# Altium schematic symbol library IC_ADI.SCHLIB: 3169 symbols (part 25 of 181)
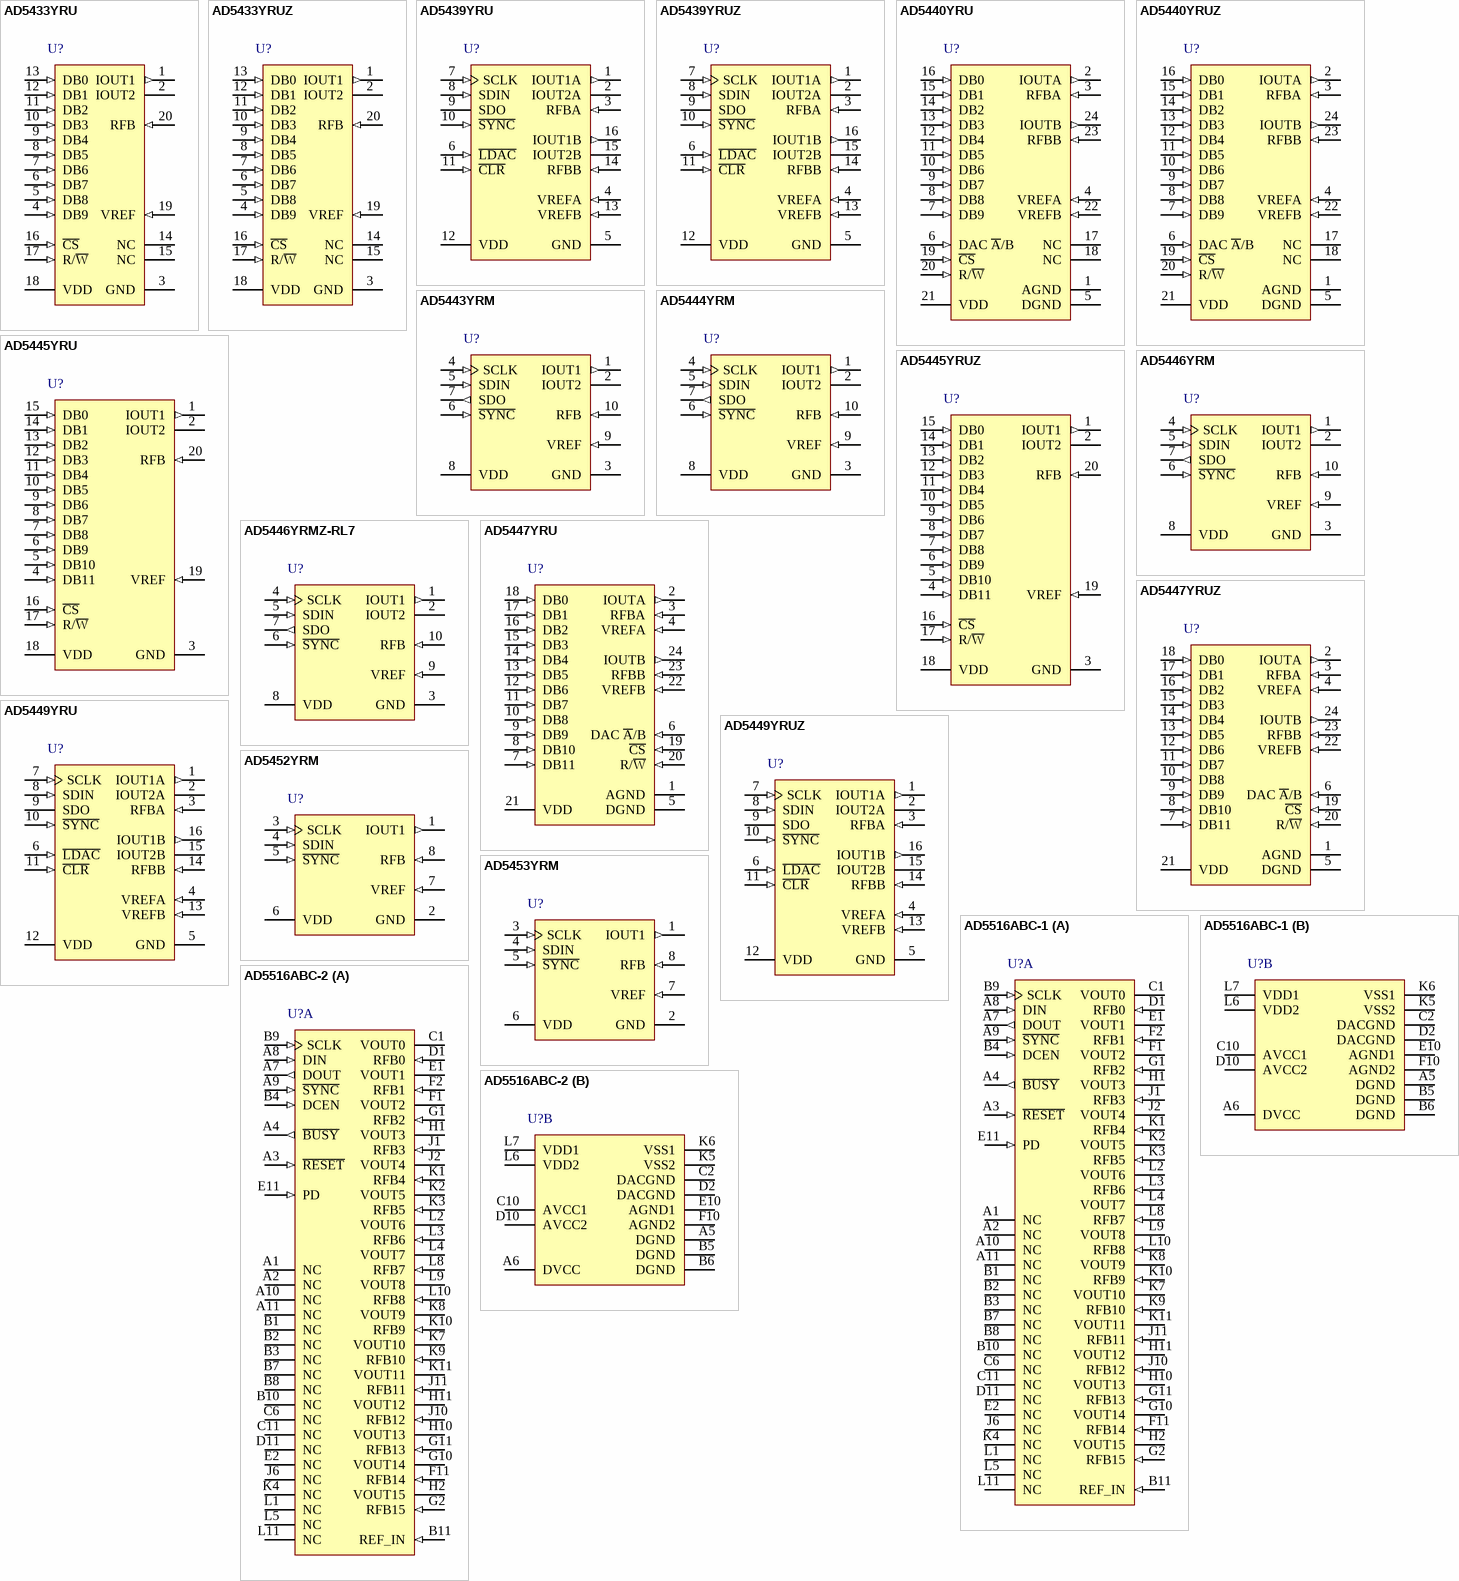
[diagram p215: symbols AD5433YRU to AD5516ABC-2]

## AD5516ABC-1
designator U?
16 Channel 14-Bit Digital-to-Analog Converter, -40 to +85 degC, BC-74, Tray; Generic Part Number: AD5516; PartNumber: AD5516ABC-1; # DAC Outputs: 16; Max V+: 13.2V; Op Pwr Diss: 243mW; Resolution (Bits): 14; Settling Time: 32祍; Single Supply: No; DatasheetVersion: Rev.B; PackageVersion: 061306-A; PackageReference: BC-74; PackageDescription: 74-Ball Chip Scale Package Ball Grid Array [CSP_BGA]; Supplier Part Number 1: AD5516ABC-1-ND; Supplier Part Number 2: 97C8341; Supplier Part Number 3: 584-AD5516ABC-1; Packing: Tray; RoHS: N; Mounting Technology: Surface Mount; Code_JEDEC: MO-192-ABD-1; ComponentLink1Description: Manufacturer URL; ComponentLink2Description: Datasheet; ComponentLink3Description: Package Specification; ComponentLink4Description: Product URL
footprint BGA74_1.0(12X12) (Footprint not found)
part A pins: A1 NC "Not Internally Connected", A2 NC "Not Internally Connected", A3 ~{RESET} (in) "Active Low Control Input. This resets all DAC registers to power-on value.", A4 ~{BUSY} (out) "Active Low Output. This signal tells the user that the analog calibration loop is active. It goes low during conversion.The duration of the pulse on B\U\S\Y\ determines the maximum DAC update rate, fUPDATE. Further writes to (See Datasheet)", A7 DOUT (out) "Serial Data Output. DOUT can be used for daisy-chaining a number of devices together or for reading back the data in the shift register for diagnostic purposes. Data is clocked out on DOUT on the rising edge of SCLK and is (See Datasheet)", A8 DIN (in) "Serial Data Input. Data must be valid on the falling edge of SCLK.", A9 ~{SYNC} (in) "Active Low Input. This is the frame synchronization signal for the serial interface. While S\Y\N\C\ is low, data is transferred in on the falling edge of SCLK.", A10 NC "Not Internally Connected", A11 NC "Not Internally Connected", B1 NC "Not Internally Connected", B2 NC "Not Internally Connected", B3 NC "Not Internally Connected", B4 DCEN (in) "Active High Control Input. This pin is tied high to enable Daisy-Chain Mode.", B7 NC "Not Internally Connected", B8 NC "Not Internally Connected", B9 SCLK (in) "Serial Clock Input. Data is clocked into the shift register on the falling edge of SCLK. This operates at clock speeds up to 20 MHz.", B10 NC "Not Internally Connected", B11 REF_IN (in) "Reference Input Voltage for All 16 DACs. The recommended value of REF_IN is 3 V.", C1 VOUT0 (hiz) "Analog Output Voltages from the 16 DAC Channels", C6 NC "Not Internally Connected", C11 NC "Not Internally Connected", D1 RFB0 (in) "Feedback Resistors. For nominal output voltage range, connect each RFB to its corresponding VOUT. Access to the feedback resistors enables the user to increase the DAC current drive or generate programmable current sources. (See Datasheet)", D11 NC "Not Internally Connected", E1 VOUT1 (hiz) "Analog Output Voltages from the 16 DAC Channels", E2 NC "Not Internally Connected", E11 PD (in) "Active High Control Input. All DACs go into power-down mode when this pin is high. The DAC outputs go into a high impedance state.", F1 VOUT2 (hiz) "Analog Output Voltages from the 16 DAC Channels", F2 RFB1 (in) "Feedback Resistors. For nominal output voltage range, connect each RFB to its corresponding VOUT. Access to the feedback resistors enables the user to increase the DAC current drive or generate programmable current sources. (See Datasheet)", F11 RFB14 (in) "Feedback Resistors. For nominal output voltage range, connect each RFB to its corresponding VOUT. Access to the feedback resistors enables the user to increase the DAC current drive or generate programmable current sources. (See Datasheet)", G1 RFB2 (in) "Feedback Resistors. For nominal output voltage range, connect each RFB to its corresponding VOUT. Access to the feedback resistors enables the user to increase the DAC current drive or generate programmable current sources. (See Datasheet)", G2 RFB15 (in) "Feedback Resistors. For nominal output voltage range, connect each RFB to its corresponding VOUT. Access to the feedback resistors enables the user to increase the DAC current drive or generate programmable current sources. (See Datasheet)", G10 VOUT14 (hiz) "Analog Output Voltages from the 16 DAC Channels", G11 RFB13 (in) "Feedback Resistors. For nominal output voltage range, connect each RFB to its corresponding VOUT. Access to the feedback resistors enables the user to increase the DAC current drive or generate programmable current sources. (See Datasheet)", H1 VOUT3 (hiz) "Analog Output Voltages from the 16 DAC Channels", H2 VOUT15 (hiz) "Analog Output Voltages from the 16 DAC Channels", H10 VOUT13 (hiz) "Analog Output Voltages from the 16 DAC Channels", H11 VOUT12 (hiz) "Analog Output Voltages from the 16 DAC Channels", J1 RFB3 (in) "Feedback Resistors. For nominal output voltage range, connect each RFB to its corresponding VOUT. Access to the feedback resistors enables the user to increase the DAC current drive or generate programmable current sources. (See Datasheet)", J2 VOUT4 (hiz) "Analog Output Voltages from the 16 DAC Channels", J6 NC "Not Internally Connected", J10 RFB12 (in) "Feedback Resistors. For nominal output voltage range, connect each RFB to its corresponding VOUT. Access to the feedback resistors enables the user to increase the DAC current drive or generate programmable current sources. (See Datasheet)", J11 RFB11 (in) "Feedback Resistors. For nominal output voltage range, connect each RFB to its corresponding VOUT. Access to the feedback resistors enables the user to increase the DAC current drive or generate programmable current sources. (See Datasheet)", K1 RFB4 (in) "Feedback Resistors. For nominal output voltage range, connect each RFB to its corresponding VOUT. Access to the feedback resistors enables the user to increase the DAC current drive or generate programmable current sources. (See Datasheet)", K2 VOUT5 (hiz) "Analog Output Voltages from the 16 DAC Channels", K3 RFB5 (in) "Feedback Resistors. For nominal output voltage range, connect each RFB to its corresponding VOUT. Access to the feedback resistors enables the user to increase the DAC current drive or generate programmable current sources. (See Datasheet)", K4 NC "Not Internally Connected", K7 VOUT10 (hiz) "Analog Output Voltages from the 16 DAC Channels", K8 VOUT9 (hiz) "Analog Output Voltages from the 16 DAC Channels", K9 RFB10 (in) "Feedback Resistors. For nominal output voltage range, connect each RFB to its corresponding VOUT. Access to the feedback resistors enables the user to increase the DAC current drive or generate programmable current sources. (See Datasheet)", K10 RFB9 (in) "Feedback Resistors. For nominal output voltage range, connect each RFB to its corresponding VOUT. Access to the feedback resistors enables the user to increase the DAC current drive or generate programmable current sources. (See Datasheet)", K11 VOUT11 (hiz) "Analog Output Voltages from the 16 DAC Channels", L1 NC "Not Internally Connected", L2 VOUT6 (hiz) "Analog Output Voltages from the 16 DAC Channels", L3 RFB6 (in) "Feedback Resistors. For nominal output voltage range, connect each RFB to its corresponding VOUT. Access to the feedback resistors enables the user to increase the DAC current drive or generate programmable current sources. (See Datasheet)", L4 VOUT7 (hiz) "Analog Output Voltages from the 16 DAC Channels", L5 NC "Not Internally Connected", L8 RFB7 (in) "Feedback Resistors. For nominal output voltage range, connect each RFB to its corresponding VOUT. Access to the feedback resistors enables the user to increase the DAC current drive or generate programmable current sources. (See Datasheet)", L9 VOUT8 (hiz) "Analog Output Voltages from the 16 DAC Channels", L10 RFB8 (in) "Feedback Resistors. For nominal output voltage range, connect each RFB to its corresponding VOUT. Access to the feedback resistors enables the user to increase the DAC current drive or generate programmable current sources. (See Datasheet)", L11 NC "Not Internally Connected"
part B pins: A5 DGND (power) "Digital GND Pins", A6 DVCC (power) "Digital Supply Pin. Voltage range from 2.7 V to 5.25 V.", B5 DGND (power) "Digital GND Pins", B6 DGND (power) "Digital GND Pins", C2 DACGND (power) "Reference GND Supply for All 16 DACs", C10 AVCC1 (power) "Analog Supply Pins. Voltage range from 4.75 V to 5.25 V.", D2 DACGND (power) "Reference GND Supply for All 16 DACs", D10 AVCC2 (power) "Analog Supply Pins. Voltage range from 4.75 V to 5.25 V.", E10 AGND1 (power) "Analog GND Pins", F10 AGND2 (power) "Analog GND Pins", K5 VSS2 (power) "VSS Supply Pins. Voltage range from -4.75 V to -15.75 V.", K6 VSS1 (power) "VSS Supply Pins. Voltage range from -4.75 V to -15.75 V.", L6 VDD2 (power) "VDD Supply Pins. Voltage range from 4.75 V to 15.75 V.", L7 VDD1 (power) "VDD Supply Pins. Voltage range from 4.75 V to 15.75 V."

## AD5516ABC-2
designator U?
16 Channel 14-Bit Digital-to-Analog Converter, -40 to +85 degC, BC-74, Tray; Generic Part Number: AD5516; PartNumber: AD5516ABC-2; # DAC Outputs: 16; Max V+: 13.2V; Op Pwr Diss: 243mW; Resolution (Bits): 14; Settling Time: 32祍; Single Supply: No; DatasheetVersion: Rev.B; PackageVersion: 061306-A; PackageReference: BC-74; PackageDescription: 74-Ball Chip Scale Package Ball Grid Array [CSP_BGA]; Supplier Part Number 1: AD5516ABC-2-ND; Supplier Part Number 2: 584-AD5516ABC-2; Packing: Tray; RoHS: N; Mounting Technology: Surface Mount; Code_JEDEC: MO-192-ABD-1; ComponentLink1Description: Manufacturer URL; ComponentLink2Description: Datasheet; ComponentLink3Description: Package Specification; ComponentLink4Description: Product URL
footprint BGA74_1.0(12X12) (Footprint not found)
part A pins: A1 NC "Not Internally Connected", A2 NC "Not Internally Connected", A3 ~{RESET} (in) "Active Low Control Input. This resets all DAC registers to power-on value.", A4 ~{BUSY} (out) "Active Low Output. This signal tells the user that the analog calibration loop is active. It goes low during conversion.The duration of the pulse on B\U\S\Y\ determines the maximum DAC update rate, fUPDATE. Further writes to (See Datasheet)", A7 DOUT (out) "Serial Data Output. DOUT can be used for daisy-chaining a number of devices together or for reading back the data in the shift register for diagnostic purposes. Data is clocked out on DOUT on the rising edge of SCLK and is (See Datasheet)", A8 DIN (in) "Serial Data Input. Data must be valid on the falling edge of SCLK.", A9 ~{SYNC} (in) "Active Low Input. This is the frame synchronization signal for the serial interface. While S\Y\N\C\ is low, data is transferred in on the falling edge of SCLK.", A10 NC "Not Internally Connected", A11 NC "Not Internally Connected", B1 NC "Not Internally Connected", B2 NC "Not Internally Connected", B3 NC "Not Internally Connected", B4 DCEN (in) "Active High Control Input. This pin is tied high to enable Daisy-Chain Mode.", B7 NC "Not Internally Connected", B8 NC "Not Internally Connected", B9 SCLK (in) "Serial Clock Input. Data is clocked into the shift register on the falling edge of SCLK. This operates at clock speeds up to 20 MHz.", B10 NC "Not Internally Connected", B11 REF_IN (in) "Reference Input Voltage for All 16 DACs. The recommended value of REF_IN is 3 V.", C1 VOUT0 (hiz) "Analog Output Voltages from the 16 DAC Channels", C6 NC "Not Internally Connected", C11 NC "Not Internally Connected", D1 RFB0 (in) "Feedback Resistors. For nominal output voltage range, connect each RFB to its corresponding VOUT. Access to the feedback resistors enables the user to increase the DAC current drive or generate programmable current sources. (See Datasheet)", D11 NC "Not Internally Connected", E1 VOUT1 (hiz) "Analog Output Voltages from the 16 DAC Channels", E2 NC "Not Internally Connected", E11 PD (in) "Active High Control Input. All DACs go into power-down mode when this pin is high. The DAC outputs go into a high impedance state.", F1 VOUT2 (hiz) "Analog Output Voltages from the 16 DAC Channels", F2 RFB1 (in) "Feedback Resistors. For nominal output voltage range, connect each RFB to its corresponding VOUT. Access to the feedback resistors enables the user to increase the DAC current drive or generate programmable current sources. (See Datasheet)", F11 RFB14 (in) "Feedback Resistors. For nominal output voltage range, connect each RFB to its corresponding VOUT. Access to the feedback resistors enables the user to increase the DAC current drive or generate programmable current sources. (See Datasheet)", G1 RFB2 (in) "Feedback Resistors. For nominal output voltage range, connect each RFB to its corresponding VOUT. Access to the feedback resistors enables the user to increase the DAC current drive or generate programmable current sources. (See Datasheet)", G2 RFB15 (in) "Feedback Resistors. For nominal output voltage range, connect each RFB to its corresponding VOUT. Access to the feedback resistors enables the user to increase the DAC current drive or generate programmable current sources. (See Datasheet)", G10 VOUT14 (hiz) "Analog Output Voltages from the 16 DAC Channels", G11 RFB13 (in) "Feedback Resistors. For nominal output voltage range, connect each RFB to its corresponding VOUT. Access to the feedback resistors enables the user to increase the DAC current drive or generate programmable current sources. (See Datasheet)", H1 VOUT3 (hiz) "Analog Output Voltages from the 16 DAC Channels", H2 VOUT15 (hiz) "Analog Output Voltages from the 16 DAC Channels", H10 VOUT13 (hiz) "Analog Output Voltages from the 16 DAC Channels", H11 VOUT12 (hiz) "Analog Output Voltages from the 16 DAC Channels", J1 RFB3 (in) "Feedback Resistors. For nominal output voltage range, connect each RFB to its corresponding VOUT. Access to the feedback resistors enables the user to increase the DAC current drive or generate programmable current sources. (See Datasheet)", J2 VOUT4 (hiz) "Analog Output Voltages from the 16 DAC Channels", J6 NC "Not Internally Connected", J10 RFB12 (in) "Feedback Resistors. For nominal output voltage range, connect each RFB to its corresponding VOUT. Access to the feedback resistors enables the user to increase the DAC current drive or generate programmable current sources. (See Datasheet)", J11 RFB11 (in) "Feedback Resistors. For nominal output voltage range, connect each RFB to its corresponding VOUT. Access to the feedback resistors enables the user to increase the DAC current drive or generate programmable current sources. (See Datasheet)", K1 RFB4 (in) "Feedback Resistors. For nominal output voltage range, connect each RFB to its corresponding VOUT. Access to the feedback resistors enables the user to increase the DAC current drive or generate programmable current sources. (See Datasheet)", K2 VOUT5 (hiz) "Analog Output Voltages from the 16 DAC Channels", K3 RFB5 (in) "Feedback Resistors. For nominal output voltage range, connect each RFB to its corresponding VOUT. Access to the feedback resistors enables the user to increase the DAC current drive or generate programmable current sources. (See Datasheet)", K4 NC "Not Internally Connected", K7 VOUT10 (hiz) "Analog Output Voltages from the 16 DAC Channels", K8 VOUT9 (hiz) "Analog Output Voltages from the 16 DAC Channels", K9 RFB10 (in) "Feedback Resistors. For nominal output voltage range, connect each RFB to its corresponding VOUT. Access to the feedback resistors enables the user to increase the DAC current drive or generate programmable current sources. (See Datasheet)", K10 RFB9 (in) "Feedback Resistors. For nominal output voltage range, connect each RFB to its corresponding VOUT. Access to the feedback resistors enables the user to increase the DAC current drive or generate programmable current sources. (See Datasheet)", K11 VOUT11 (hiz) "Analog Output Voltages from the 16 DAC Channels", L1 NC "Not Internally Connected", L2 VOUT6 (hiz) "Analog Output Voltages from the 16 DAC Channels", L3 RFB6 (in) "Feedback Resistors. For nominal output voltage range, connect each RFB to its corresponding VOUT. Access to the feedback resistors enables the user to increase the DAC current drive or generate programmable current sources. (See Datasheet)", L4 VOUT7 (hiz) "Analog Output Voltages from the 16 DAC Channels", L5 NC "Not Internally Connected", L8 RFB7 (in) "Feedback Resistors. For nominal output voltage range, connect each RFB to its corresponding VOUT. Access to the feedback resistors enables the user to increase the DAC current drive or generate programmable current sources. (See Datasheet)", L9 VOUT8 (hiz) "Analog Output Voltages from the 16 DAC Channels", L10 RFB8 (in) "Feedback Resistors. For nominal output voltage range, connect each RFB to its corresponding VOUT. Access to the feedback resistors enables the user to increase the DAC current drive or generate programmable current sources. (See Datasheet)", L11 NC "Not Internally Connected"
part B pins: A5 DGND (power) "Digital GND Pins", A6 DVCC (power) "Digital Supply Pin. Voltage range from 2.7 V to 5.25 V.", B5 DGND (power) "Digital GND Pins", B6 DGND (power) "Digital GND Pins", C2 DACGND (power) "Reference GND Supply for All 16 DACs", C10 AVCC1 (power) "Analog Supply Pins. Voltage range from 4.75 V to 5.25 V.", D2 DACGND (power) "Reference GND Supply for All 16 DACs", D10 AVCC2 (power) "Analog Supply Pins. Voltage range from 4.75 V to 5.25 V.", E10 AGND1 (power) "Analog GND Pins", F10 AGND2 (power) "Analog GND Pins", K5 VSS2 (power) "VSS Supply Pins. Voltage range from -4.75 V to -15.75 V.", K6 VSS1 (power) "VSS Supply Pins. Voltage range from -4.75 V to -15.75 V.", L6 VDD2 (power) "VDD Supply Pins. Voltage range from 4.75 V to 15.75 V.", L7 VDD1 (power) "VDD Supply Pins. Voltage range from 4.75 V to 15.75 V."

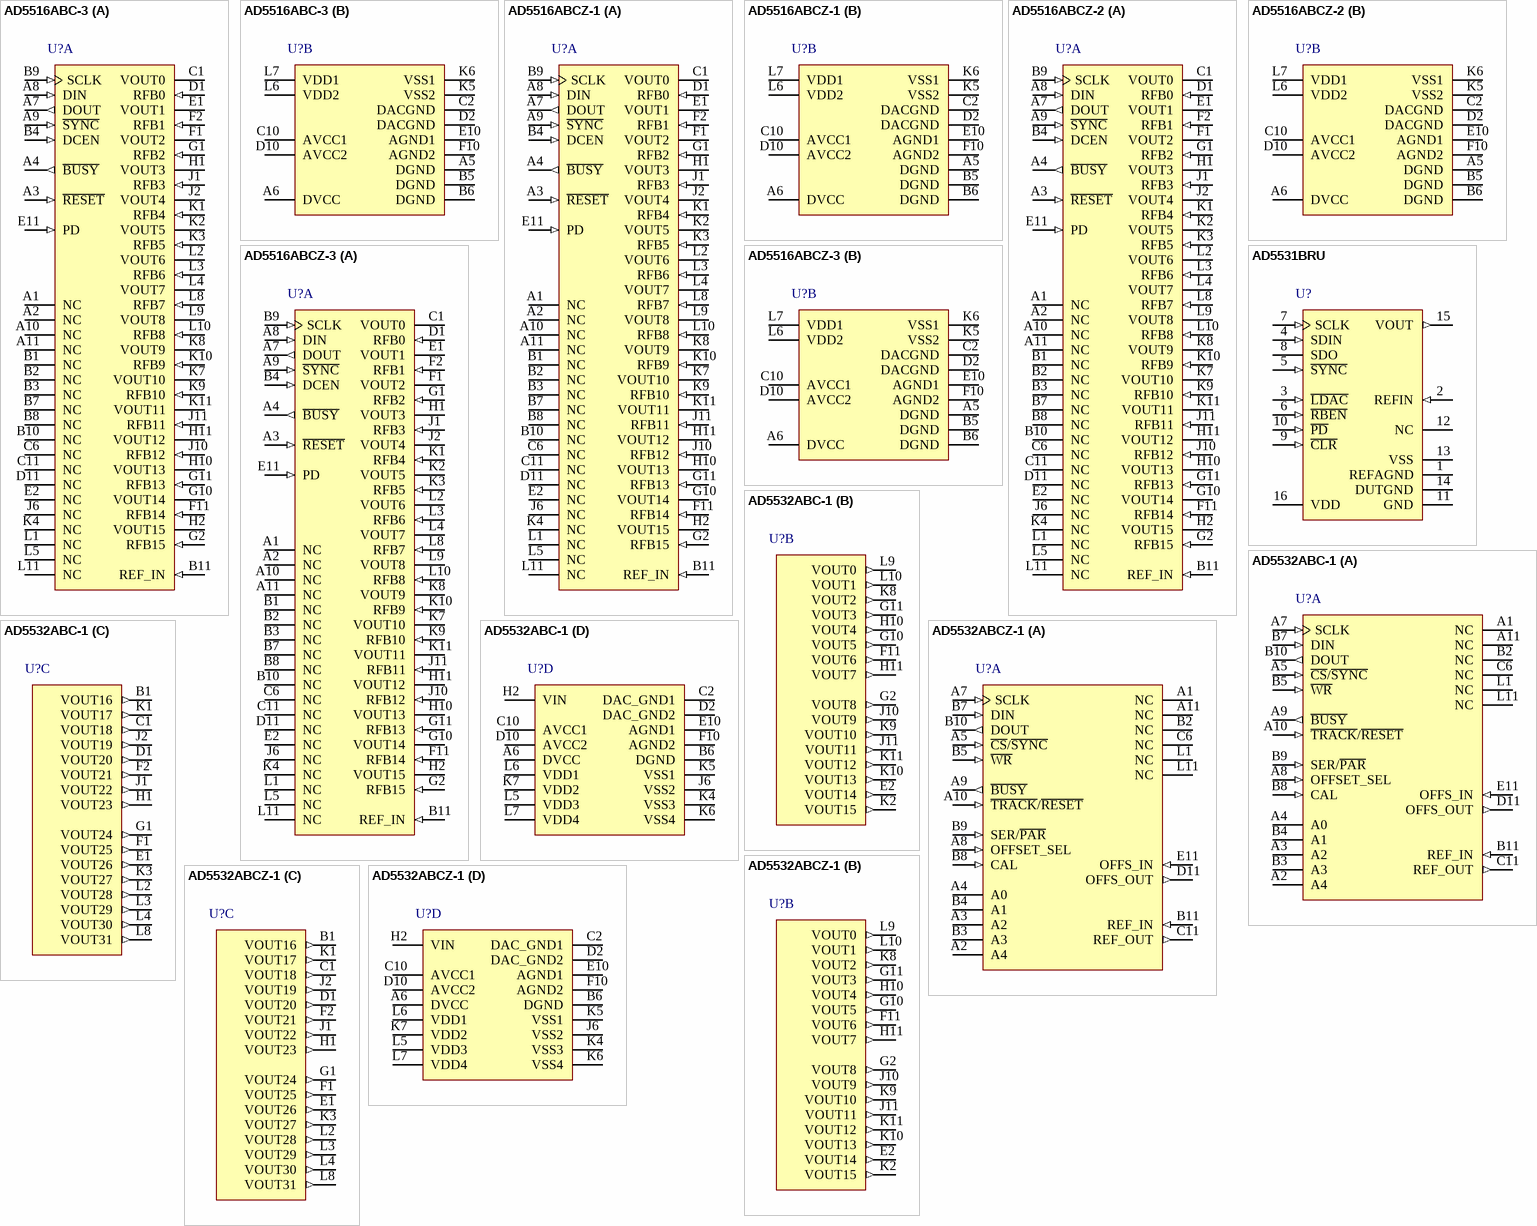
[diagram p21: symbols AD5516ABC-3 to AD5532ABCZ-1]

## AD5516ABC-3
designator U?
16 Channel 14-Bit Digital-to-Analog Converter, -40 to +85 degC, BC-74, Tray; Generic Part Number: AD5516; PartNumber: AD5516ABC-3; # DAC Outputs: 16; Max V+: 13.2V; Op Pwr Diss: 243mW; Resolution (Bits): 14; Settling Time: 32祍; Single Supply: No; DatasheetVersion: Rev.B; PackageVersion: 061306-A; PackageReference: BC-74; PackageDescription: 74-Ball Chip Scale Package Ball Grid Array [CSP_BGA]; Supplier Part Number 1: AD5516ABC-3-ND; Supplier Part Number 2: 97C7188; Supplier Part Number 3: 584-AD5516ABC-3; Packing: Tray; RoHS: N; Mounting Technology: Surface Mount; Code_JEDEC: MO-192-ABD-1; ComponentLink1Description: Manufacturer URL; ComponentLink2Description: Datasheet; ComponentLink3Description: Package Specification; ComponentLink4Description: Product URL
footprint BGA74_1.0(12X12) (Footprint not found)
part A pins: A1 NC "Not Internally Connected", A2 NC "Not Internally Connected", A3 ~{RESET} (in) "Active Low Control Input. This resets all DAC registers to power-on value.", A4 ~{BUSY} (out) "Active Low Output. This signal tells the user that the analog calibration loop is active. It goes low during conversion.The duration of the pulse on B\U\S\Y\ determines the maximum DAC update rate, fUPDATE. Further writes to (See Datasheet)", A7 DOUT (out) "Serial Data Output. DOUT can be used for daisy-chaining a number of devices together or for reading back the data in the shift register for diagnostic purposes. Data is clocked out on DOUT on the rising edge of SCLK and is (See Datasheet)", A8 DIN (in) "Serial Data Input. Data must be valid on the falling edge of SCLK.", A9 ~{SYNC} (in) "Active Low Input. This is the frame synchronization signal for the serial interface. While S\Y\N\C\ is low, data is transferred in on the falling edge of SCLK.", A10 NC "Not Internally Connected", A11 NC "Not Internally Connected", B1 NC "Not Internally Connected", B2 NC "Not Internally Connected", B3 NC "Not Internally Connected", B4 DCEN (in) "Active High Control Input. This pin is tied high to enable Daisy-Chain Mode.", B7 NC "Not Internally Connected", B8 NC "Not Internally Connected", B9 SCLK (in) "Serial Clock Input. Data is clocked into the shift register on the falling edge of SCLK. This operates at clock speeds up to 20 MHz.", B10 NC "Not Internally Connected", B11 REF_IN (in) "Reference Input Voltage for All 16 DACs. The recommended value of REF_IN is 3 V.", C1 VOUT0 (hiz) "Analog Output Voltages from the 16 DAC Channels", C6 NC "Not Internally Connected", C11 NC "Not Internally Connected", D1 RFB0 (in) "Feedback Resistors. For nominal output voltage range, connect each RFB to its corresponding VOUT. Access to the feedback resistors enables the user to increase the DAC current drive or generate programmable current sources. (See Datasheet)", D11 NC "Not Internally Connected", E1 VOUT1 (hiz) "Analog Output Voltages from the 16 DAC Channels", E2 NC "Not Internally Connected", E11 PD (in) "Active High Control Input. All DACs go into power-down mode when this pin is high. The DAC outputs go into a high impedance state.", F1 VOUT2 (hiz) "Analog Output Voltages from the 16 DAC Channels", F2 RFB1 (in) "Feedback Resistors. For nominal output voltage range, connect each RFB to its corresponding VOUT. Access to the feedback resistors enables the user to increase the DAC current drive or generate programmable current sources. (See Datasheet)", F11 RFB14 (in) "Feedback Resistors. For nominal output voltage range, connect each RFB to its corresponding VOUT. Access to the feedback resistors enables the user to increase the DAC current drive or generate programmable current sources. (See Datasheet)", G1 RFB2 (in) "Feedback Resistors. For nominal output voltage range, connect each RFB to its corresponding VOUT. Access to the feedback resistors enables the user to increase the DAC current drive or generate programmable current sources. (See Datasheet)", G2 RFB15 (in) "Feedback Resistors. For nominal output voltage range, connect each RFB to its corresponding VOUT. Access to the feedback resistors enables the user to increase the DAC current drive or generate programmable current sources. (See Datasheet)", G10 VOUT14 (hiz) "Analog Output Voltages from the 16 DAC Channels", G11 RFB13 (in) "Feedback Resistors. For nominal output voltage range, connect each RFB to its corresponding VOUT. Access to the feedback resistors enables the user to increase the DAC current drive or generate programmable current sources. (See Datasheet)", H1 VOUT3 (hiz) "Analog Output Voltages from the 16 DAC Channels", H2 VOUT15 (hiz) "Analog Output Voltages from the 16 DAC Channels", H10 VOUT13 (hiz) "Analog Output Voltages from the 16 DAC Channels", H11 VOUT12 (hiz) "Analog Output Voltages from the 16 DAC Channels", J1 RFB3 (in) "Feedback Resistors. For nominal output voltage range, connect each RFB to its corresponding VOUT. Access to the feedback resistors enables the user to increase the DAC current drive or generate programmable current sources. (See Datasheet)", J2 VOUT4 (hiz) "Analog Output Voltages from the 16 DAC Channels", J6 NC "Not Internally Connected", J10 RFB12 (in) "Feedback Resistors. For nominal output voltage range, connect each RFB to its corresponding VOUT. Access to the feedback resistors enables the user to increase the DAC current drive or generate programmable current sources. (See Datasheet)", J11 RFB11 (in) "Feedback Resistors. For nominal output voltage range, connect each RFB to its corresponding VOUT. Access to the feedback resistors enables the user to increase the DAC current drive or generate programmable current sources. (See Datasheet)", K1 RFB4 (in) "Feedback Resistors. For nominal output voltage range, connect each RFB to its corresponding VOUT. Access to the feedback resistors enables the user to increase the DAC current drive or generate programmable current sources. (See Datasheet)", K2 VOUT5 (hiz) "Analog Output Voltages from the 16 DAC Channels", K3 RFB5 (in) "Feedback Resistors. For nominal output voltage range, connect each RFB to its corresponding VOUT. Access to the feedback resistors enables the user to increase the DAC current drive or generate programmable current sources. (See Datasheet)", K4 NC "Not Internally Connected", K7 VOUT10 (hiz) "Analog Output Voltages from the 16 DAC Channels", K8 VOUT9 (hiz) "Analog Output Voltages from the 16 DAC Channels", K9 RFB10 (in) "Feedback Resistors. For nominal output voltage range, connect each RFB to its corresponding VOUT. Access to the feedback resistors enables the user to increase the DAC current drive or generate programmable current sources. (See Datasheet)", K10 RFB9 (in) "Feedback Resistors. For nominal output voltage range, connect each RFB to its corresponding VOUT. Access to the feedback resistors enables the user to increase the DAC current drive or generate programmable current sources. (See Datasheet)", K11 VOUT11 (hiz) "Analog Output Voltages from the 16 DAC Channels", L1 NC "Not Internally Connected", L2 VOUT6 (hiz) "Analog Output Voltages from the 16 DAC Channels", L3 RFB6 (in) "Feedback Resistors. For nominal output voltage range, connect each RFB to its corresponding VOUT. Access to the feedback resistors enables the user to increase the DAC current drive or generate programmable current sources. (See Datasheet)", L4 VOUT7 (hiz) "Analog Output Voltages from the 16 DAC Channels", L5 NC "Not Internally Connected", L8 RFB7 (in) "Feedback Resistors. For nominal output voltage range, connect each RFB to its corresponding VOUT. Access to the feedback resistors enables the user to increase the DAC current drive or generate programmable current sources. (See Datasheet)", L9 VOUT8 (hiz) "Analog Output Voltages from the 16 DAC Channels", L10 RFB8 (in) "Feedback Resistors. For nominal output voltage range, connect each RFB to its corresponding VOUT. Access to the feedback resistors enables the user to increase the DAC current drive or generate programmable current sources. (See Datasheet)", L11 NC "Not Internally Connected"
part B pins: A5 DGND (power) "Digital GND Pins", A6 DVCC (power) "Digital Supply Pin. Voltage range from 2.7 V to 5.25 V.", B5 DGND (power) "Digital GND Pins", B6 DGND (power) "Digital GND Pins", C2 DACGND (power) "Reference GND Supply for All 16 DACs", C10 AVCC1 (power) "Analog Supply Pins. Voltage range from 4.75 V to 5.25 V.", D2 DACGND (power) "Reference GND Supply for All 16 DACs", D10 AVCC2 (power) "Analog Supply Pins. Voltage range from 4.75 V to 5.25 V.", E10 AGND1 (power) "Analog GND Pins", F10 AGND2 (power) "Analog GND Pins", K5 VSS2 (power) "VSS Supply Pins. Voltage range from -4.75 V to -15.75 V.", K6 VSS1 (power) "VSS Supply Pins. Voltage range from -4.75 V to -15.75 V.", L6 VDD2 (power) "VDD Supply Pins. Voltage range from 4.75 V to 15.75 V.", L7 VDD1 (power) "VDD Supply Pins. Voltage range from 4.75 V to 15.75 V."

## AD5516ABCZ-1
designator U?
16 Channel 14-Bit Digital-to-Analog Converter, -40 to +85 degC, BC-74, Pb-Free, Tray; Generic Part Number: AD5516; PartNumber: AD5516ABCZ-1; # DAC Outputs: 16; Max V+: 13.2V; Op Pwr Diss: 243mW; Resolution (Bits): 14; Settling Time: 32祍; Single Supply: No; DatasheetVersion: Rev.B; PackageVersion: 061306-A; PackageReference: BC-74; PackageDescription: 74-Ball Chip Scale Package Ball Grid Array [CSP_BGA]; Supplier Part Number 1: AD5516ABCZ-1-ND; Supplier Part Number 2: 584-AD5516ABCZ-1; Packing: Tray; RoHS: Y; Mounting Technology: Surface Mount; Code_JEDEC: MO-192-ABD-1; ComponentLink1Description: Manufacturer URL; ComponentLink2Description: Datasheet; ComponentLink3Description: Package Specification; ComponentLink4Description: Product URL
footprint BGA74_1.0(12X12) (Footprint not found)
part A pins: A1 NC "Not Internally Connected", A2 NC "Not Internally Connected", A3 ~{RESET} (in) "Active Low Control Input. This resets all DAC registers to power-on value.", A4 ~{BUSY} (out) "Active Low Output. This signal tells the user that the analog calibration loop is active. It goes low during conversion.The duration of the pulse on B\U\S\Y\ determines the maximum DAC update rate, fUPDATE. Further writes to (See Datasheet)", A7 DOUT (out) "Serial Data Output. DOUT can be used for daisy-chaining a number of devices together or for reading back the data in the shift register for diagnostic purposes. Data is clocked out on DOUT on the rising edge of SCLK and is (See Datasheet)", A8 DIN (in) "Serial Data Input. Data must be valid on the falling edge of SCLK.", A9 ~{SYNC} (in) "Active Low Input. This is the frame synchronization signal for the serial interface. While S\Y\N\C\ is low, data is transferred in on the falling edge of SCLK.", A10 NC "Not Internally Connected", A11 NC "Not Internally Connected", B1 NC "Not Internally Connected", B2 NC "Not Internally Connected", B3 NC "Not Internally Connected", B4 DCEN (in) "Active High Control Input. This pin is tied high to enable Daisy-Chain Mode.", B7 NC "Not Internally Connected", B8 NC "Not Internally Connected", B9 SCLK (in) "Serial Clock Input. Data is clocked into the shift register on the falling edge of SCLK. This operates at clock speeds up to 20 MHz.", B10 NC "Not Internally Connected", B11 REF_IN (in) "Reference Input Voltage for All 16 DACs. The recommended value of REF_IN is 3 V.", C1 VOUT0 (hiz) "Analog Output Voltages from the 16 DAC Channels", C6 NC "Not Internally Connected", C11 NC "Not Internally Connected", D1 RFB0 (in) "Feedback Resistors. For nominal output voltage range, connect each RFB to its corresponding VOUT. Access to the feedback resistors enables the user to increase the DAC current drive or generate programmable current sources. (See Datasheet)", D11 NC "Not Internally Connected", E1 VOUT1 (hiz) "Analog Output Voltages from the 16 DAC Channels", E2 NC "Not Internally Connected", E11 PD (in) "Active High Control Input. All DACs go into power-down mode when this pin is high. The DAC outputs go into a high impedance state.", F1 VOUT2 (hiz) "Analog Output Voltages from the 16 DAC Channels", F2 RFB1 (in) "Feedback Resistors. For nominal output voltage range, connect each RFB to its corresponding VOUT. Access to the feedback resistors enables the user to increase the DAC current drive or generate programmable current sources. (See Datasheet)", F11 RFB14 (in) "Feedback Resistors. For nominal output voltage range, connect each RFB to its corresponding VOUT. Access to the feedback resistors enables the user to increase the DAC current drive or generate programmable current sources. (See Datasheet)", G1 RFB2 (in) "Feedback Resistors. For nominal output voltage range, connect each RFB to its corresponding VOUT. Access to the feedback resistors enables the user to increase the DAC current drive or generate programmable current sources. (See Datasheet)", G2 RFB15 (in) "Feedback Resistors. For nominal output voltage range, connect each RFB to its corresponding VOUT. Access to the feedback resistors enables the user to increase the DAC current drive or generate programmable current sources. (See Datasheet)", G10 VOUT14 (hiz) "Analog Output Voltages from the 16 DAC Channels", G11 RFB13 (in) "Feedback Resistors. For nominal output voltage range, connect each RFB to its corresponding VOUT. Access to the feedback resistors enables the user to increase the DAC current drive or generate programmable current sources. (See Datasheet)", H1 VOUT3 (hiz) "Analog Output Voltages from the 16 DAC Channels", H2 VOUT15 (hiz) "Analog Output Voltages from the 16 DAC Channels", H10 VOUT13 (hiz) "Analog Output Voltages from the 16 DAC Channels", H11 VOUT12 (hiz) "Analog Output Voltages from the 16 DAC Channels", J1 RFB3 (in) "Feedback Resistors. For nominal output voltage range, connect each RFB to its corresponding VOUT. Access to the feedback resistors enables the user to increase the DAC current drive or generate programmable current sources. (See Datasheet)", J2 VOUT4 (hiz) "Analog Output Voltages from the 16 DAC Channels", J6 NC "Not Internally Connected", J10 RFB12 (in) "Feedback Resistors. For nominal output voltage range, connect each RFB to its corresponding VOUT. Access to the feedback resistors enables the user to increase the DAC current drive or generate programmable current sources. (See Datasheet)", J11 RFB11 (in) "Feedback Resistors. For nominal output voltage range, connect each RFB to its corresponding VOUT. Access to the feedback resistors enables the user to increase the DAC current drive or generate programmable current sources. (See Datasheet)", K1 RFB4 (in) "Feedback Resistors. For nominal output voltage range, connect each RFB to its corresponding VOUT. Access to the feedback resistors enables the user to increase the DAC current drive or generate programmable current sources. (See Datasheet)", K2 VOUT5 (hiz) "Analog Output Voltages from the 16 DAC Channels", K3 RFB5 (in) "Feedback Resistors. For nominal output voltage range, connect each RFB to its corresponding VOUT. Access to the feedback resistors enables the user to increase the DAC current drive or generate programmable current sources. (See Datasheet)", K4 NC "Not Internally Connected", K7 VOUT10 (hiz) "Analog Output Voltages from the 16 DAC Channels", K8 VOUT9 (hiz) "Analog Output Voltages from the 16 DAC Channels", K9 RFB10 (in) "Feedback Resistors. For nominal output voltage range, connect each RFB to its corresponding VOUT. Access to the feedback resistors enables the user to increase the DAC current drive or generate programmable current sources. (See Datasheet)", K10 RFB9 (in) "Feedback Resistors. For nominal output voltage range, connect each RFB to its corresponding VOUT. Access to the feedback resistors enables the user to increase the DAC current drive or generate programmable current sources. (See Datasheet)", K11 VOUT11 (hiz) "Analog Output Voltages from the 16 DAC Channels", L1 NC "Not Internally Connected", L2 VOUT6 (hiz) "Analog Output Voltages from the 16 DAC Channels", L3 RFB6 (in) "Feedback Resistors. For nominal output voltage range, connect each RFB to its corresponding VOUT. Access to the feedback resistors enables the user to increase the DAC current drive or generate programmable current sources. (See Datasheet)", L4 VOUT7 (hiz) "Analog Output Voltages from the 16 DAC Channels", L5 NC "Not Internally Connected", L8 RFB7 (in) "Feedback Resistors. For nominal output voltage range, connect each RFB to its corresponding VOUT. Access to the feedback resistors enables the user to increase the DAC current drive or generate programmable current sources. (See Datasheet)", L9 VOUT8 (hiz) "Analog Output Voltages from the 16 DAC Channels", L10 RFB8 (in) "Feedback Resistors. For nominal output voltage range, connect each RFB to its corresponding VOUT. Access to the feedback resistors enables the user to increase the DAC current drive or generate programmable current sources. (See Datasheet)", L11 NC "Not Internally Connected"
part B pins: A5 DGND (power) "Digital GND Pins", A6 DVCC (power) "Digital Supply Pin. Voltage range from 2.7 V to 5.25 V.", B5 DGND (power) "Digital GND Pins", B6 DGND (power) "Digital GND Pins", C2 DACGND (power) "Reference GND Supply for All 16 DACs", C10 AVCC1 (power) "Analog Supply Pins. Voltage range from 4.75 V to 5.25 V.", D2 DACGND (power) "Reference GND Supply for All 16 DACs", D10 AVCC2 (power) "Analog Supply Pins. Voltage range from 4.75 V to 5.25 V.", E10 AGND1 (power) "Analog GND Pins", F10 AGND2 (power) "Analog GND Pins", K5 VSS2 (power) "VSS Supply Pins. Voltage range from -4.75 V to -15.75 V.", K6 VSS1 (power) "VSS Supply Pins. Voltage range from -4.75 V to -15.75 V.", L6 VDD2 (power) "VDD Supply Pins. Voltage range from 4.75 V to 15.75 V.", L7 VDD1 (power) "VDD Supply Pins. Voltage range from 4.75 V to 15.75 V."

## AD5516ABCZ-2
designator U?
16 Channel 14-Bit Digital-to-Analog Converter, -40 to +85 degC, BC-74, Pb-Free, Tray; Generic Part Number: AD5516; PartNumber: AD5516ABCZ-2; # DAC Outputs: 16; Max V+: 13.2V; Op Pwr Diss: 243mW; Resolution (Bits): 14; Settling Time: 32祍; Single Supply: No; DatasheetVersion: Rev.B; PackageVersion: 061306-A; PackageReference: BC-74; PackageDescription: 74-Ball Chip Scale Package Ball Grid Array [CSP_BGA]; Supplier Part Number 1: AD5516ABCZ-2-ND; Supplier Part Number 2: 584-AD5516ABCZ-2; Packing: Tray; RoHS: Y; Mounting Technology: Surface Mount; Code_JEDEC: MO-192-ABD-1; ComponentLink1Description: Manufacturer URL; ComponentLink2Description: Datasheet; ComponentLink3Description: Package Specification; ComponentLink4Description: Product URL
footprint BGA74_1.0(12X12) (Footprint not found)
part A pins: A1 NC "Not Internally Connected", A2 NC "Not Internally Connected", A3 ~{RESET} (in) "Active Low Control Input. This resets all DAC registers to power-on value.", A4 ~{BUSY} (out) "Active Low Output. This signal tells the user that the analog calibration loop is active. It goes low during conversion.The duration of the pulse on B\U\S\Y\ determines the maximum DAC update rate, fUPDATE. Further writes to (See Datasheet)", A7 DOUT (out) "Serial Data Output. DOUT can be used for daisy-chaining a number of devices together or for reading back the data in the shift register for diagnostic purposes. Data is clocked out on DOUT on the rising edge of SCLK and is (See Datasheet)", A8 DIN (in) "Serial Data Input. Data must be valid on the falling edge of SCLK.", A9 ~{SYNC} (in) "Active Low Input. This is the frame synchronization signal for the serial interface. While S\Y\N\C\ is low, data is transferred in on the falling edge of SCLK.", A10 NC "Not Internally Connected", A11 NC "Not Internally Connected", B1 NC "Not Internally Connected", B2 NC "Not Internally Connected", B3 NC "Not Internally Connected", B4 DCEN (in) "Active High Control Input. This pin is tied high to enable Daisy-Chain Mode.", B7 NC "Not Internally Connected", B8 NC "Not Internally Connected", B9 SCLK (in) "Serial Clock Input. Data is clocked into the shift register on the falling edge of SCLK. This operates at clock speeds up to 20 MHz.", B10 NC "Not Internally Connected", B11 REF_IN (in) "Reference Input Voltage for All 16 DACs. The recommended value of REF_IN is 3 V.", C1 VOUT0 (hiz) "Analog Output Voltages from the 16 DAC Channels", C6 NC "Not Internally Connected", C11 NC "Not Internally Connected", D1 RFB0 (in) "Feedback Resistors. For nominal output voltage range, connect each RFB to its corresponding VOUT. Access to the feedback resistors enables the user to increase the DAC current drive or generate programmable current sources. (See Datasheet)", D11 NC "Not Internally Connected", E1 VOUT1 (hiz) "Analog Output Voltages from the 16 DAC Channels", E2 NC "Not Internally Connected", E11 PD (in) "Active High Control Input. All DACs go into power-down mode when this pin is high. The DAC outputs go into a high impedance state.", F1 VOUT2 (hiz) "Analog Output Voltages from the 16 DAC Channels", F2 RFB1 (in) "Feedback Resistors. For nominal output voltage range, connect each RFB to its corresponding VOUT. Access to the feedback resistors enables the user to increase the DAC current drive or generate programmable current sources. (See Datasheet)", F11 RFB14 (in) "Feedback Resistors. For nominal output voltage range, connect each RFB to its corresponding VOUT. Access to the feedback resistors enables the user to increase the DAC current drive or generate programmable current sources. (See Datasheet)", G1 RFB2 (in) "Feedback Resistors. For nominal output voltage range, connect each RFB to its corresponding VOUT. Access to the feedback resistors enables the user to increase the DAC current drive or generate programmable current sources. (See Datasheet)", G2 RFB15 (in) "Feedback Resistors. For nominal output voltage range, connect each RFB to its corresponding VOUT. Access to the feedback resistors enables the user to increase the DAC current drive or generate programmable current sources. (See Datasheet)", G10 VOUT14 (hiz) "Analog Output Voltages from the 16 DAC Channels", G11 RFB13 (in) "Feedback Resistors. For nominal output voltage range, connect each RFB to its corresponding VOUT. Access to the feedback resistors enables the user to increase the DAC current drive or generate programmable current sources. (See Datasheet)", H1 VOUT3 (hiz) "Analog Output Voltages from the 16 DAC Channels", H2 VOUT15 (hiz) "Analog Output Voltages from the 16 DAC Channels", H10 VOUT13 (hiz) "Analog Output Voltages from the 16 DAC Channels", H11 VOUT12 (hiz) "Analog Output Voltages from the 16 DAC Channels", J1 RFB3 (in) "Feedback Resistors. For nominal output voltage range, connect each RFB to its corresponding VOUT. Access to the feedback resistors enables the user to increase the DAC current drive or generate programmable current sources. (See Datasheet)", J2 VOUT4 (hiz) "Analog Output Voltages from the 16 DAC Channels", J6 NC "Not Internally Connected", J10 RFB12 (in) "Feedback Resistors. For nominal output voltage range, connect each RFB to its corresponding VOUT. Access to the feedback resistors enables the user to increase the DAC current drive or generate programmable current sources. (See Datasheet)", J11 RFB11 (in) "Feedback Resistors. For nominal output voltage range, connect each RFB to its corresponding VOUT. Access to the feedback resistors enables the user to increase the DAC current drive or generate programmable current sources. (See Datasheet)", K1 RFB4 (in) "Feedback Resistors. For nominal output voltage range, connect each RFB to its corresponding VOUT. Access to the feedback resistors enables the user to increase the DAC current drive or generate programmable current sources. (See Datasheet)", K2 VOUT5 (hiz) "Analog Output Voltages from the 16 DAC Channels", K3 RFB5 (in) "Feedback Resistors. For nominal output voltage range, connect each RFB to its corresponding VOUT. Access to the feedback resistors enables the user to increase the DAC current drive or generate programmable current sources. (See Datasheet)", K4 NC "Not Internally Connected", K7 VOUT10 (hiz) "Analog Output Voltages from the 16 DAC Channels", K8 VOUT9 (hiz) "Analog Output Voltages from the 16 DAC Channels", K9 RFB10 (in) "Feedback Resistors. For nominal output voltage range, connect each RFB to its corresponding VOUT. Access to the feedback resistors enables the user to increase the DAC current drive or generate programmable current sources. (See Datasheet)", K10 RFB9 (in) "Feedback Resistors. For nominal output voltage range, connect each RFB to its corresponding VOUT. Access to the feedback resistors enables the user to increase the DAC current drive or generate programmable current sources. (See Datasheet)", K11 VOUT11 (hiz) "Analog Output Voltages from the 16 DAC Channels", L1 NC "Not Internally Connected", L2 VOUT6 (hiz) "Analog Output Voltages from the 16 DAC Channels", L3 RFB6 (in) "Feedback Resistors. For nominal output voltage range, connect each RFB to its corresponding VOUT. Access to the feedback resistors enables the user to increase the DAC current drive or generate programmable current sources. (See Datasheet)", L4 VOUT7 (hiz) "Analog Output Voltages from the 16 DAC Channels", L5 NC "Not Internally Connected", L8 RFB7 (in) "Feedback Resistors. For nominal output voltage range, connect each RFB to its corresponding VOUT. Access to the feedback resistors enables the user to increase the DAC current drive or generate programmable current sources. (See Datasheet)", L9 VOUT8 (hiz) "Analog Output Voltages from the 16 DAC Channels", L10 RFB8 (in) "Feedback Resistors. For nominal output voltage range, connect each RFB to its corresponding VOUT. Access to the feedback resistors enables the user to increase the DAC current drive or generate programmable current sources. (See Datasheet)", L11 NC "Not Internally Connected"
part B pins: A5 DGND (power) "Digital GND Pins", A6 DVCC (power) "Digital Supply Pin. Voltage range from 2.7 V to 5.25 V.", B5 DGND (power) "Digital GND Pins", B6 DGND (power) "Digital GND Pins", C2 DACGND (power) "Reference GND Supply for All 16 DACs", C10 AVCC1 (power) "Analog Supply Pins. Voltage range from 4.75 V to 5.25 V.", D2 DACGND (power) "Reference GND Supply for All 16 DACs", D10 AVCC2 (power) "Analog Supply Pins. Voltage range from 4.75 V to 5.25 V.", E10 AGND1 (power) "Analog GND Pins", F10 AGND2 (power) "Analog GND Pins", K5 VSS2 (power) "VSS Supply Pins. Voltage range from -4.75 V to -15.75 V.", K6 VSS1 (power) "VSS Supply Pins. Voltage range from -4.75 V to -15.75 V.", L6 VDD2 (power) "VDD Supply Pins. Voltage range from 4.75 V to 15.75 V.", L7 VDD1 (power) "VDD Supply Pins. Voltage range from 4.75 V to 15.75 V."